# Altium footprint library ICs And Semiconductors SMD_BGA.PcbLib: 118 footprints (part 9 of 17)
Each footprint in its own frame and in the unit in brackets; x right, y up, seen from the top. Pads: shape width x height; smd on the part's side, far side on the other; paste and mask are expansions set on the pad; w line width, h text height; cw(c..) or ccw(c..) is an arc to the next point about the centre after c.
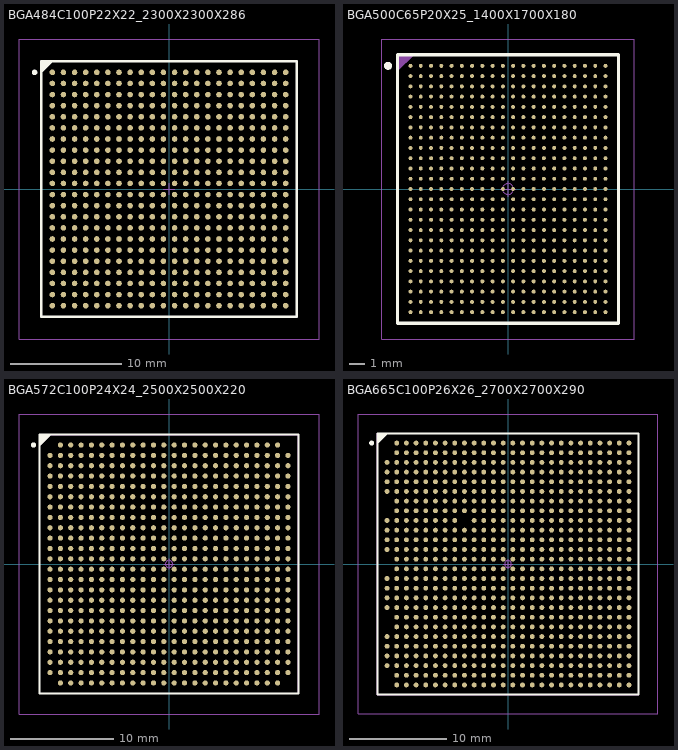
[diagram p8: the footprints below, top view; thin cyan lines are the x and y axes]

## BGA484C100P22X22_2300X2300X286 [mm] "BGA, 1.00mm Pitch, Square; 484 Pin, 22 Columns X 22 Rows, 23.00mm X 23.00mm X 2.86mm H"
height 2.86
pads (484):
  round 0.5 smd: A1(-10.5,10.5) A2(-9.5,10.5) A3(-8.5,10.5) A4(-7.5,10.5) A5(-6.5,10.5) A6(-5.5,10.5) A7(-4.5,10.5) A8(-3.5,10.5) A9(-2.5,10.5) A10(-1.5,10.5) A11(-0.5,10.5) A12(0.5,10.5) A13(1.5,10.5) A14(2.5,10.5) A15(3.5,10.5) A16(4.5,10.5) A17(5.5,10.5) A18(6.5,10.5) A19(7.5,10.5) A20(8.5,10.5) A21(9.5,10.5) A22(10.5,10.5) AA1(-10.5,-9.5) AA2(-9.5,-9.5) AA3(-8.5,-9.5) AA4(-7.5,-9.5) AA5(-6.5,-9.5) AA6(-5.5,-9.5) AA7(-4.5,-9.5) AA8(-3.5,-9.5) AA9(-2.5,-9.5) AA10(-1.5,-9.5) AA11(-0.5,-9.5) AA12(0.5,-9.5) AA13(1.5,-9.5) AA14(2.5,-9.5) AA15(3.5,-9.5) AA16(4.5,-9.5) AA17(5.5,-9.5) AA18(6.5,-9.5) AA19(7.5,-9.5) AA20(8.5,-9.5) AA21(9.5,-9.5) AA22(10.5,-9.5) AB1(-10.5,-10.5) AB2(-9.5,-10.5) AB3(-8.5,-10.5) AB4(-7.5,-10.5) AB5(-6.5,-10.5) AB6(-5.5,-10.5) AB7(-4.5,-10.5) AB8(-3.5,-10.5) AB9(-2.5,-10.5) AB10(-1.5,-10.5) AB11(-0.5,-10.5) AB12(0.5,-10.5) AB13(1.5,-10.5) AB14(2.5,-10.5) AB15(3.5,-10.5) AB16(4.5,-10.5) AB17(5.5,-10.5) AB18(6.5,-10.5) AB19(7.5,-10.5) AB20(8.5,-10.5) AB21(9.5,-10.5) AB22(10.5,-10.5) B1(-10.5,9.5) B2(-9.5,9.5) B3(-8.5,9.5) B4(-7.5,9.5) B5(-6.5,9.5) B6(-5.5,9.5) B7(-4.5,9.5) B8(-3.5,9.5) B9(-2.5,9.5) B10(-1.5,9.5) B11(-0.5,9.5) B12(0.5,9.5) B13(1.5,9.5) B14(2.5,9.5) B15(3.5,9.5) B16(4.5,9.5) B17(5.5,9.5) B18(6.5,9.5) B19(7.5,9.5) B20(8.5,9.5) B21(9.5,9.5) B22(10.5,9.5) C1(-10.5,8.5) C2(-9.5,8.5) C3(-8.5,8.5) C4(-7.5,8.5) C5(-6.5,8.5) C6(-5.5,8.5) C7(-4.5,8.5) C8(-3.5,8.5) C9(-2.5,8.5) C10(-1.5,8.5) C11(-0.5,8.5) C12(0.5,8.5) C13(1.5,8.5) C14(2.5,8.5) C15(3.5,8.5) C16(4.5,8.5) C17(5.5,8.5) C18(6.5,8.5) C19(7.5,8.5) C20(8.5,8.5) C21(9.5,8.5) C22(10.5,8.5) D1(-10.5,7.5) D2(-9.5,7.5) D3(-8.5,7.5) D4(-7.5,7.5) D5(-6.5,7.5) D6(-5.5,7.5) D7(-4.5,7.5) D8(-3.5,7.5) D9(-2.5,7.5) D10(-1.5,7.5) D11(-0.5,7.5) D12(0.5,7.5) D13(1.5,7.5) D14(2.5,7.5) D15(3.5,7.5) D16(4.5,7.5) D17(5.5,7.5) D18(6.5,7.5) D19(7.5,7.5) D20(8.5,7.5) D21(9.5,7.5) D22(10.5,7.5) E1(-10.5,6.5) E2(-9.5,6.5) E3(-8.5,6.5) E4(-7.5,6.5) E5(-6.5,6.5) E6(-5.5,6.5) E7(-4.5,6.5) E8(-3.5,6.5) E9(-2.5,6.5) E10(-1.5,6.5) E11(-0.5,6.5) E12(0.5,6.5) E13(1.5,6.5) E14(2.5,6.5) E15(3.5,6.5) E16(4.5,6.5) E17(5.5,6.5) E18(6.5,6.5) E19(7.5,6.5) E20(8.5,6.5) E21(9.5,6.5) E22(10.5,6.5) F1(-10.5,5.5) F2(-9.5,5.5) F3(-8.5,5.5) F4(-7.5,5.5) F5(-6.5,5.5) F6(-5.5,5.5) F7(-4.5,5.5) F8(-3.5,5.5) F9(-2.5,5.5) F10(-1.5,5.5) F11(-0.5,5.5) F12(0.5,5.5) F13(1.5,5.5) F14(2.5,5.5) F15(3.5,5.5) F16(4.5,5.5) F17(5.5,5.5) F18(6.5,5.5) F19(7.5,5.5) F20(8.5,5.5) F21(9.5,5.5) F22(10.5,5.5) G1(-10.5,4.5) G2(-9.5,4.5) G3(-8.5,4.5) G4(-7.5,4.5) G5(-6.5,4.5) G6(-5.5,4.5) G7(-4.5,4.5) G8(-3.5,4.5) G9(-2.5,4.5) G10(-1.5,4.5) G11(-0.5,4.5) G12(0.5,4.5) G13(1.5,4.5) G14(2.5,4.5) G15(3.5,4.5) G16(4.5,4.5) G17(5.5,4.5) G18(6.5,4.5) G19(7.5,4.5) G20(8.5,4.5) G21(9.5,4.5) G22(10.5,4.5) H1(-10.5,3.5) H2(-9.5,3.5) H3(-8.5,3.5) H4(-7.5,3.5) H5(-6.5,3.5) H6(-5.5,3.5) H7(-4.5,3.5) H8(-3.5,3.5) H9(-2.5,3.5) H10(-1.5,3.5) H11(-0.5,3.5) H12(0.5,3.5) H13(1.5,3.5) H14(2.5,3.5) H15(3.5,3.5) H16(4.5,3.5) H17(5.5,3.5) H18(6.5,3.5) H19(7.5,3.5) H20(8.5,3.5) H21(9.5,3.5) H22(10.5,3.5) J1(-10.5,2.5) J2(-9.5,2.5) J3(-8.5,2.5) J4(-7.5,2.5) J5(-6.5,2.5) J6(-5.5,2.5) J7(-4.5,2.5) J8(-3.5,2.5) J9(-2.5,2.5) J10(-1.5,2.5) J11(-0.5,2.5) J12(0.5,2.5) J13(1.5,2.5) J14(2.5,2.5) J15(3.5,2.5) J16(4.5,2.5) J17(5.5,2.5) J18(6.5,2.5) J19(7.5,2.5) J20(8.5,2.5) J21(9.5,2.5) J22(10.5,2.5) K1(-10.5,1.5) K2(-9.5,1.5) K3(-8.5,1.5) K4(-7.5,1.5) K5(-6.5,1.5) K6(-5.5,1.5) K7(-4.5,1.5) K8(-3.5,1.5) K9(-2.5,1.5) K10(-1.5,1.5) K11(-0.5,1.5) K12(0.5,1.5) K13(1.5,1.5) K14(2.5,1.5) K15(3.5,1.5) K16(4.5,1.5) K17(5.5,1.5) K18(6.5,1.5) K19(7.5,1.5) K20(8.5,1.5) K21(9.5,1.5) K22(10.5,1.5) L1(-10.5,0.5) L2(-9.5,0.5) L3(-8.5,0.5) L4(-7.5,0.5) L5(-6.5,0.5) L6(-5.5,0.5) L7(-4.5,0.5) L8(-3.5,0.5) L9(-2.5,0.5) L10(-1.5,0.5) L11(-0.5,0.5) L12(0.5,0.5) L13(1.5,0.5) L14(2.5,0.5) L15(3.5,0.5) L16(4.5,0.5) L17(5.5,0.5) L18(6.5,0.5) L19(7.5,0.5) L20(8.5,0.5) L21(9.5,0.5) L22(10.5,0.5) M1(-10.5,-0.5) M2(-9.5,-0.5) M3(-8.5,-0.5) M4(-7.5,-0.5) M5(-6.5,-0.5) M6(-5.5,-0.5) M7(-4.5,-0.5) M8(-3.5,-0.5) M9(-2.5,-0.5) M10(-1.5,-0.5) M11(-0.5,-0.5) M12(0.5,-0.5) M13(1.5,-0.5) M14(2.5,-0.5) M15(3.5,-0.5) M16(4.5,-0.5) M17(5.5,-0.5) M18(6.5,-0.5) M19(7.5,-0.5) M20(8.5,-0.5) M21(9.5,-0.5) M22(10.5,-0.5) N1(-10.5,-1.5) N2(-9.5,-1.5) N3(-8.5,-1.5) N4(-7.5,-1.5) N5(-6.5,-1.5) N6(-5.5,-1.5) N7(-4.5,-1.5) N8(-3.5,-1.5) N9(-2.5,-1.5) N10(-1.5,-1.5) N11(-0.5,-1.5) N12(0.5,-1.5) N13(1.5,-1.5) N14(2.5,-1.5) N15(3.5,-1.5) N16(4.5,-1.5) N17(5.5,-1.5) N18(6.5,-1.5) N19(7.5,-1.5) N20(8.5,-1.5) N21(9.5,-1.5) N22(10.5,-1.5) P1(-10.5,-2.5) P2(-9.5,-2.5) P3(-8.5,-2.5) P4(-7.5,-2.5) P5(-6.5,-2.5) P6(-5.5,-2.5) P7(-4.5,-2.5) P8(-3.5,-2.5) P9(-2.5,-2.5) P10(-1.5,-2.5) P11(-0.5,-2.5) P12(0.5,-2.5) P13(1.5,-2.5) P14(2.5,-2.5) P15(3.5,-2.5) P16(4.5,-2.5) P17(5.5,-2.5) P18(6.5,-2.5) P19(7.5,-2.5) P20(8.5,-2.5) P21(9.5,-2.5) P22(10.5,-2.5) R1(-10.5,-3.5) R2(-9.5,-3.5) R3(-8.5,-3.5) R4(-7.5,-3.5) R5(-6.5,-3.5) R6(-5.5,-3.5) R7(-4.5,-3.5) R8(-3.5,-3.5) R9(-2.5,-3.5) R10(-1.5,-3.5) R11(-0.5,-3.5) R12(0.5,-3.5) R13(1.5,-3.5) R14(2.5,-3.5) R15(3.5,-3.5) R16(4.5,-3.5) R17(5.5,-3.5) R18(6.5,-3.5) R19(7.5,-3.5) R20(8.5,-3.5) R21(9.5,-3.5) R22(10.5,-3.5) T1(-10.5,-4.5) T2(-9.5,-4.5) T3(-8.5,-4.5) T4(-7.5,-4.5) T5(-6.5,-4.5) T6(-5.5,-4.5) T7(-4.5,-4.5) T8(-3.5,-4.5) T9(-2.5,-4.5) T10(-1.5,-4.5) T11(-0.5,-4.5) T12(0.5,-4.5) T13(1.5,-4.5) T14(2.5,-4.5) T15(3.5,-4.5) T16(4.5,-4.5) T17(5.5,-4.5) T18(6.5,-4.5) T19(7.5,-4.5) T20(8.5,-4.5) T21(9.5,-4.5) T22(10.5,-4.5) U1(-10.5,-5.5) U2(-9.5,-5.5) U3(-8.5,-5.5) U4(-7.5,-5.5) U5(-6.5,-5.5) U6(-5.5,-5.5) U7(-4.5,-5.5) U8(-3.5,-5.5) U9(-2.5,-5.5) U10(-1.5,-5.5) U11(-0.5,-5.5) U12(0.5,-5.5) U13(1.5,-5.5) U14(2.5,-5.5) U15(3.5,-5.5) U16(4.5,-5.5) U17(5.5,-5.5) U18(6.5,-5.5) U19(7.5,-5.5) U20(8.5,-5.5) U21(9.5,-5.5) U22(10.5,-5.5) V1(-10.5,-6.5) V2(-9.5,-6.5) V3(-8.5,-6.5) V4(-7.5,-6.5) V5(-6.5,-6.5) V6(-5.5,-6.5) V7(-4.5,-6.5) V8(-3.5,-6.5) V9(-2.5,-6.5) V10(-1.5,-6.5) V11(-0.5,-6.5) V12(0.5,-6.5) V13(1.5,-6.5) V14(2.5,-6.5) V15(3.5,-6.5) V16(4.5,-6.5) V17(5.5,-6.5) V18(6.5,-6.5) V19(7.5,-6.5) V20(8.5,-6.5) V21(9.5,-6.5) V22(10.5,-6.5) W1(-10.5,-7.5) W2(-9.5,-7.5) W3(-8.5,-7.5) W4(-7.5,-7.5) W5(-6.5,-7.5) W6(-5.5,-7.5) W7(-4.5,-7.5) W8(-3.5,-7.5) W9(-2.5,-7.5) W10(-1.5,-7.5) W11(-0.5,-7.5) W12(0.5,-7.5) W13(1.5,-7.5) W14(2.5,-7.5) W15(3.5,-7.5) W16(4.5,-7.5) W17(5.5,-7.5) W18(6.5,-7.5) W19(7.5,-7.5) W20(8.5,-7.5) W21(9.5,-7.5) W22(10.5,-7.5) Y1(-10.5,-8.5) Y2(-9.5,-8.5) Y3(-8.5,-8.5) Y4(-7.5,-8.5) Y5(-6.5,-8.5) Y6(-5.5,-8.5) Y7(-4.5,-8.5) Y8(-3.5,-8.5) Y9(-2.5,-8.5) Y10(-1.5,-8.5) Y11(-0.5,-8.5) Y12(0.5,-8.5) Y13(1.5,-8.5) Y14(2.5,-8.5) Y15(3.5,-8.5) Y16(4.5,-8.5) Y17(5.5,-8.5) Y18(6.5,-8.5) Y19(7.5,-8.5) Y20(8.5,-8.5) Y21(9.5,-8.5) Y22(10.5,-8.5)
Top Overlay:
  circle w0.25: c-12.1,10.5 r0.125
  lines w0.2: -11.5,10.5 -10.5,11.5 ; -11.5,10.7 -10.7,11.5 ; -11.5,10.9 -10.9,11.5 ; -11.5,11.1 -11.1,11.5 ; -11.5,11.3 -11.3,11.5 ; -11.5,-11.5 0,-11.5 11.5,-11.5 11.5,11.5 -11.5,11.5 -11.5,-11.5
Mechanical 14:
  lines w0.1: -11.5,10.5 -10.5,11.5 ; -11.5,10.6 -10.6,11.5 ; -11.5,10.7 -10.7,11.5 ; -11.5,10.8 -10.8,11.5 ; -11.5,10.9 -10.9,11.5 ; -11.5,11 -11,11.5 ; -11.5,11.1 -11.1,11.5 ; -11.5,11.2 -11.2,11.5 ; -11.5,11.3 -11.3,11.5 ; -11.5,11.4 -11.4,11.5 ; -11.5,-11.5 -11.5,11.5 11.5,11.5 11.5,-11.5 0,-11.5 -11.5,-11.5
  text "AB" at -12.9,-10.8 h0.6
  text "AA" at -12.9,-9.8 h0.6
  text "Y" at -12.4,-8.8 h0.6
  text "W" at -12.4,-7.8 h0.6
  text "V" at -12.4,-6.8 h0.6
  text "U" at -12.4,-5.8 h0.6
  text "T" at -12.4,-4.8 h0.6
  text "R" at -12.4,-3.8 h0.6
  text "P" at -12.4,-2.8 h0.6
  text "N" at -12.4,-1.8 h0.6
  text "M" at -12.4,-0.8 h0.6
  text "L" at -12.4,0.2 h0.6
  text "K" at -12.4,1.2 h0.6
  text "J" at -12.4,2.2 h0.6
  text "H" at -12.4,3.2 h0.6
  text "G" at -12.4,4.2 h0.6
  text "F" at -12.4,5.2 h0.6
  text "E" at -12.4,6.2 h0.6
  text "D" at -12.4,7.2 h0.6
  text "C" at -12.4,8.2 h0.6
  text "B" at -12.4,9.2 h0.6
  text "A" at -12.4,10.2 h0.6
  text "2" at -9.25,12 h0.6
  text "3" at -8.25,12 h0.6
  text "4" at -7.25,12 h0.6
  text "5" at -6.25,12 h0.6
  text "16" at 4.75,12 h0.6
  text "15" at 3.75,12 h0.6
  text "14" at 2.75,12 h0.6
  text "13" at 1.75,12 h0.6
  text "12" at 0.75,12 h0.6
  text "11" at -0.25,12 h0.6
  text "10" at -1.25,12 h0.6
  text "9" at -2.25,12 h0.6
  text "8" at -3.25,12 h0.6
  text "7" at -4.25,12 h0.6
  text "6" at -5.25,12 h0.6
  text "1" at -10.25,12 h0.6
  text "18" at 6.75,12 h0.6
  text "19" at 7.75,12 h0.6
  text "20" at 8.75,12 h0.6
  text "21" at 9.75,12 h0.6
  text "22" at 10.7,12 h0.6
  text "17" at 5.75,12 h0.6
Mechanical 15:
  lines w0.05: -0.5,0 0.5,0 ; 0,-0.5 0,0.5 ; -13.5,-13.5 -13.5,13.5 13.5,13.5 13.5,-13.5 -13.5,-13.5
3D body "BGA484C100P22X22_2300X2300X286.stp": height 2.86, standoff 0, extent -11.5,-11.5 11.5,11.5

## BGA500C65P20X25_1400X1700X180 [mm] "BGA,0.65mm Pitch, Rect. ;500 Pin, 20 Columns X 25 Rows, 14.00mm X 17.00mm X 1.80mm H"
height 1.8
pads (500):
  round 0.25 smd: A1(-6.175,7.8) A2(-5.525,7.8) A3(-4.875,7.8) A4(-4.225,7.8) A5(-3.575,7.8) A6(-2.925,7.8) A7(-2.275,7.8) A8(-1.625,7.8) A9(-0.975,7.8) A10(-0.325,7.8) A11(0.325,7.8) A12(0.975,7.8) A13(1.625,7.8) A14(2.275,7.8) A15(2.925,7.8) A16(3.575,7.8) A17(4.225,7.8) A18(4.875,7.8) A19(5.525,7.8) A20(6.175,7.8) AA1(-6.175,-5.2) AA2(-5.525,-5.2) AA3(-4.875,-5.2) AA4(-4.225,-5.2) AA5(-3.575,-5.2) AA6(-2.925,-5.2) AA7(-2.275,-5.2) AA8(-1.625,-5.2) AA9(-0.975,-5.2) AA10(-0.325,-5.2) AA11(0.325,-5.2) AA12(0.975,-5.2) AA13(1.625,-5.2) AA14(2.275,-5.2) AA15(2.925,-5.2) AA16(3.575,-5.2) AA17(4.225,-5.2) AA18(4.875,-5.2) AA19(5.525,-5.2) AA20(6.175,-5.2) AB1(-6.175,-5.85) AB2(-5.525,-5.85) AB3(-4.875,-5.85) AB4(-4.225,-5.85) AB5(-3.575,-5.85) AB6(-2.925,-5.85) AB7(-2.275,-5.85) AB8(-1.625,-5.85) AB9(-0.975,-5.85) AB10(-0.325,-5.85) AB11(0.325,-5.85) AB12(0.975,-5.85) AB13(1.625,-5.85) AB14(2.275,-5.85) AB15(2.925,-5.85) AB16(3.575,-5.85) AB17(4.225,-5.85) AB18(4.875,-5.85) AB19(5.525,-5.85) AB20(6.175,-5.85) AC1(-6.175,-6.5) AC2(-5.525,-6.5) AC3(-4.875,-6.5) AC4(-4.225,-6.5) AC5(-3.575,-6.5) AC6(-2.925,-6.5) AC7(-2.275,-6.5) AC8(-1.625,-6.5) AC9(-0.975,-6.5) AC10(-0.325,-6.5) AC11(0.325,-6.5) AC12(0.975,-6.5) AC13(1.625,-6.5) AC14(2.275,-6.5) AC15(2.925,-6.5) AC16(3.575,-6.5) AC17(4.225,-6.5) AC18(4.875,-6.5) AC19(5.525,-6.5) AC20(6.175,-6.5) AD1(-6.175,-7.15) AD2(-5.525,-7.15) AD3(-4.875,-7.15) AD4(-4.225,-7.15) AD5(-3.575,-7.15) AD6(-2.925,-7.15) AD7(-2.275,-7.15) AD8(-1.625,-7.15) AD9(-0.975,-7.15) AD10(-0.325,-7.15) AD11(0.325,-7.15) AD12(0.975,-7.15) AD13(1.625,-7.15) AD14(2.275,-7.15) AD15(2.925,-7.15) AD16(3.575,-7.15) AD17(4.225,-7.15) AD18(4.875,-7.15) AD19(5.525,-7.15) AD20(6.175,-7.15) AE1(-6.175,-7.8) AE2(-5.525,-7.8) AE3(-4.875,-7.8) AE4(-4.225,-7.8) AE5(-3.575,-7.8) AE6(-2.925,-7.8) AE7(-2.275,-7.8) AE8(-1.625,-7.8) AE9(-0.975,-7.8) AE10(-0.325,-7.8) AE11(0.325,-7.8) AE12(0.975,-7.8) AE13(1.625,-7.8) AE14(2.275,-7.8) AE15(2.925,-7.8) AE16(3.575,-7.8) AE17(4.225,-7.8) AE18(4.875,-7.8) AE19(5.525,-7.8) AE20(6.175,-7.8) B1(-6.175,7.15) B2(-5.525,7.15) B3(-4.875,7.15) B4(-4.225,7.15) B5(-3.575,7.15) B6(-2.925,7.15) B7(-2.275,7.15) B8(-1.625,7.15) B9(-0.975,7.15) B10(-0.325,7.15) B11(0.325,7.15) B12(0.975,7.15) B13(1.625,7.15) B14(2.275,7.15) B15(2.925,7.15) B16(3.575,7.15) B17(4.225,7.15) B18(4.875,7.15) B19(5.525,7.15) B20(6.175,7.15) C1(-6.175,6.5) C2(-5.525,6.5) C3(-4.875,6.5) C4(-4.225,6.5) C5(-3.575,6.5) C6(-2.925,6.5) C7(-2.275,6.5) C8(-1.625,6.5) C9(-0.975,6.5) C10(-0.325,6.5) C11(0.325,6.5) C12(0.975,6.5) C13(1.625,6.5) C14(2.275,6.5) C15(2.925,6.5) C16(3.575,6.5) C17(4.225,6.5) C18(4.875,6.5) C19(5.525,6.5) C20(6.175,6.5) D1(-6.175,5.85) D2(-5.525,5.85) D3(-4.875,5.85) D4(-4.225,5.85) D5(-3.575,5.85) D6(-2.925,5.85) D7(-2.275,5.85) D8(-1.625,5.85) D9(-0.975,5.85) D10(-0.325,5.85) D11(0.325,5.85) D12(0.975,5.85) D13(1.625,5.85) D14(2.275,5.85) D15(2.925,5.85) D16(3.575,5.85) D17(4.225,5.85) D18(4.875,5.85) D19(5.525,5.85) D20(6.175,5.85) E1(-6.175,5.2) E2(-5.525,5.2) E3(-4.875,5.2) E4(-4.225,5.2) E5(-3.575,5.2) E6(-2.925,5.2) E7(-2.275,5.2) E8(-1.625,5.2) E9(-0.975,5.2) E10(-0.325,5.2) E11(0.325,5.2) E12(0.975,5.2) E13(1.625,5.2) E14(2.275,5.2) E15(2.925,5.2) E16(3.575,5.2) E17(4.225,5.2) E18(4.875,5.2) E19(5.525,5.2) E20(6.175,5.2) F1(-6.175,4.55) F2(-5.525,4.55) F3(-4.875,4.55) F4(-4.225,4.55) F5(-3.575,4.55) F6(-2.925,4.55) F7(-2.275,4.55) F8(-1.625,4.55) F9(-0.975,4.55) F10(-0.325,4.55) F11(0.325,4.55) F12(0.975,4.55) F13(1.625,4.55) F14(2.275,4.55) F15(2.925,4.55) F16(3.575,4.55) F17(4.225,4.55) F18(4.875,4.55) F19(5.525,4.55) F20(6.175,4.55) G1(-6.175,3.9) G2(-5.525,3.9) G3(-4.875,3.9) G4(-4.225,3.9) G5(-3.575,3.9) G6(-2.925,3.9) G7(-2.275,3.9) G8(-1.625,3.9) G9(-0.975,3.9) G10(-0.325,3.9) G11(0.325,3.9) G12(0.975,3.9) G13(1.625,3.9) G14(2.275,3.9) G15(2.925,3.9) G16(3.575,3.9) G17(4.225,3.9) G18(4.875,3.9) G19(5.525,3.9) G20(6.175,3.9) H1(-6.175,3.25) H2(-5.525,3.25) H3(-4.875,3.25) H4(-4.225,3.25) H5(-3.575,3.25) H6(-2.925,3.25) H7(-2.275,3.25) H8(-1.625,3.25) H9(-0.975,3.25) H10(-0.325,3.25) H11(0.325,3.25) H12(0.975,3.25) H13(1.625,3.25) H14(2.275,3.25) H15(2.925,3.25) H16(3.575,3.25) H17(4.225,3.25) H18(4.875,3.25) H19(5.525,3.25) H20(6.175,3.25) J1(-6.175,2.6) J2(-5.525,2.6) J3(-4.875,2.6) J4(-4.225,2.6) J5(-3.575,2.6) J6(-2.925,2.6) J7(-2.275,2.6) J8(-1.625,2.6) J9(-0.975,2.6) J10(-0.325,2.6) J11(0.325,2.6) J12(0.975,2.6) J13(1.625,2.6) J14(2.275,2.6) J15(2.925,2.6) J16(3.575,2.6) J17(4.225,2.6) J18(4.875,2.6) J19(5.525,2.6) J20(6.175,2.6) K1(-6.175,1.95) K2(-5.525,1.95) K3(-4.875,1.95) K4(-4.225,1.95) K5(-3.575,1.95) K6(-2.925,1.95) K7(-2.275,1.95) K8(-1.625,1.95) K9(-0.975,1.95) K10(-0.325,1.95) K11(0.325,1.95) K12(0.975,1.95) K13(1.625,1.95) K14(2.275,1.95) K15(2.925,1.95) K16(3.575,1.95) K17(4.225,1.95) K18(4.875,1.95) K19(5.525,1.95) K20(6.175,1.95) L1(-6.175,1.3) L2(-5.525,1.3) L3(-4.875,1.3) L4(-4.225,1.3) L5(-3.575,1.3) L6(-2.925,1.3) L7(-2.275,1.3) L8(-1.625,1.3) L9(-0.975,1.3) L10(-0.325,1.3) L11(0.325,1.3) L12(0.975,1.3) L13(1.625,1.3) L14(2.275,1.3) L15(2.925,1.3) L16(3.575,1.3) L17(4.225,1.3) L18(4.875,1.3) L19(5.525,1.3) L20(6.175,1.3) M1(-6.175,0.65) M2(-5.525,0.65) M3(-4.875,0.65) M4(-4.225,0.65) M5(-3.575,0.65) M6(-2.925,0.65) M7(-2.275,0.65) M8(-1.625,0.65) M9(-0.975,0.65) M10(-0.325,0.65) M11(0.325,0.65) M12(0.975,0.65) M13(1.625,0.65) M14(2.275,0.65) M15(2.925,0.65) M16(3.575,0.65) M17(4.225,0.65) M18(4.875,0.65) M19(5.525,0.65) M20(6.175,0.65) N1(-6.175,0) N2(-5.525,0) N3(-4.875,0) N4(-4.225,0) N5(-3.575,0) N6(-2.925,0) N7(-2.275,0) N8(-1.625,0) N9(-0.975,0) N10(-0.325,0) N11(0.325,0) N12(0.975,0) N13(1.625,0) N14(2.275,0) N15(2.925,0) N16(3.575,0) N17(4.225,0) N18(4.875,0) N19(5.525,0) N20(6.175,0) P1(-6.175,-0.65) P2(-5.525,-0.65) P3(-4.875,-0.65) P4(-4.225,-0.65) P5(-3.575,-0.65) P6(-2.925,-0.65) P7(-2.275,-0.65) P8(-1.625,-0.65) P9(-0.975,-0.65) P10(-0.325,-0.65) P11(0.325,-0.65) P12(0.975,-0.65) P13(1.625,-0.65) P14(2.275,-0.65) P15(2.925,-0.65) P16(3.575,-0.65) P17(4.225,-0.65) P18(4.875,-0.65) P19(5.525,-0.65) P20(6.175,-0.65) R1(-6.175,-1.3) R2(-5.525,-1.3) R3(-4.875,-1.3) R4(-4.225,-1.3) R5(-3.575,-1.3) R6(-2.925,-1.3) R7(-2.275,-1.3) R8(-1.625,-1.3) R9(-0.975,-1.3) R10(-0.325,-1.3) R11(0.325,-1.3) R12(0.975,-1.3) R13(1.625,-1.3) R14(2.275,-1.3) R15(2.925,-1.3) R16(3.575,-1.3) R17(4.225,-1.3) R18(4.875,-1.3) R19(5.525,-1.3) R20(6.175,-1.3) T1(-6.175,-1.95) T2(-5.525,-1.95) T3(-4.875,-1.95) T4(-4.225,-1.95) T5(-3.575,-1.95) T6(-2.925,-1.95) T7(-2.275,-1.95) T8(-1.625,-1.95) T9(-0.975,-1.95) T10(-0.325,-1.95) T11(0.325,-1.95) T12(0.975,-1.95) T13(1.625,-1.95) T14(2.275,-1.95) T15(2.925,-1.95) T16(3.575,-1.95) T17(4.225,-1.95) T18(4.875,-1.95) T19(5.525,-1.95) T20(6.175,-1.95) U1(-6.175,-2.6) U2(-5.525,-2.6) U3(-4.875,-2.6) U4(-4.225,-2.6) U5(-3.575,-2.6) U6(-2.925,-2.6) U7(-2.275,-2.6) U8(-1.625,-2.6) U9(-0.975,-2.6) U10(-0.325,-2.6) U11(0.325,-2.6) U12(0.975,-2.6) U13(1.625,-2.6) U14(2.275,-2.6) U15(2.925,-2.6) U16(3.575,-2.6) U17(4.225,-2.6) U18(4.875,-2.6) U19(5.525,-2.6) U20(6.175,-2.6) V1(-6.175,-3.25) V2(-5.525,-3.25) V3(-4.875,-3.25) V4(-4.225,-3.25) V5(-3.575,-3.25) V6(-2.925,-3.25) V7(-2.275,-3.25) V8(-1.625,-3.25) V9(-0.975,-3.25) V10(-0.325,-3.25) V11(0.325,-3.25) V12(0.975,-3.25) V13(1.625,-3.25) V14(2.275,-3.25) V15(2.925,-3.25) V16(3.575,-3.25) V17(4.225,-3.25) V18(4.875,-3.25) V19(5.525,-3.25) V20(6.175,-3.25) W1(-6.175,-3.9) W2(-5.525,-3.9) W3(-4.875,-3.9) W4(-4.225,-3.9) W5(-3.575,-3.9) W6(-2.925,-3.9) W7(-2.275,-3.9) W8(-1.625,-3.9) W9(-0.975,-3.9) W10(-0.325,-3.9) W11(0.325,-3.9) W12(0.975,-3.9) W13(1.625,-3.9) W14(2.275,-3.9) W15(2.925,-3.9) W16(3.575,-3.9) W17(4.225,-3.9) W18(4.875,-3.9) W19(5.525,-3.9) W20(6.175,-3.9) Y1(-6.175,-4.55) Y2(-5.525,-4.55) Y3(-4.875,-4.55) Y4(-4.225,-4.55) Y5(-3.575,-4.55) Y6(-2.925,-4.55) Y7(-2.275,-4.55) Y8(-1.625,-4.55) Y9(-0.975,-4.55) Y10(-0.325,-4.55) Y11(0.325,-4.55) Y12(0.975,-4.55) Y13(1.625,-4.55) Y14(2.275,-4.55) Y15(2.925,-4.55) Y16(3.575,-4.55) Y17(4.225,-4.55) Y18(4.875,-4.55) Y19(5.525,-4.55) Y20(6.175,-4.55)
Top Overlay:
  circle w0.25: c-7.6,7.8 r0.125
  lines w0.2: -7,-8.5 -7,8.5 7,8.5 7,-8.5 -7,-8.5
Mechanical 14:
  lines w0.1: -7,7.5 -6,8.5 ; -7,7.6 -6.1,8.5 ; -7,7.7 -6.2,8.5 ; -7,7.8 -6.3,8.5 ; -7,7.9 -6.4,8.5 ; -7,8 -6.5,8.5 ; -7,8.1 -6.6,8.5 ; -7,8.2 -6.7,8.5 ; -7,8.3 -6.8,8.5 ; -7,8.4 -6.9,8.5 ; -7,-8.5 -7,8.5 7,8.5 7,-8.5 -7,-8.5
  text "AE" at -8.25,-8 h0.5
  text "20" at 6.5,9 h0.5
  text "A" at -7.7,7.7 h0.5
  text "1" at -6.25,8.9 h0.5
Mechanical 15:
  circle w0.05: c0,0 r0.35
  lines w0.05: -0.5,0 0.5,0 ; 0,-0.5 0,0.5 ; -8,-9.5 -8,9.5 8,9.5 8,-9.5 -8,-9.5
3D body "BGA500C65P20X25_1400X1700X180.stp": height 1.8, standoff 0, extent -7,-8.5 7,8.5

## BGA572C100P24X24_2500X2500X220 [mm] "BGA, 1.00mm Pitch, Square; 572 Pin,24 Columns X 24 Rows,25.00mm X 25.00mm X 2.20mm H"
height 2.2
pads (572):
  round 0.5 smd: A2(-10.5,11.5) A3(-9.5,11.5) A4(-8.5,11.5) A5(-7.5,11.5) A6(-6.5,11.5) A7(-5.5,11.5) A8(-4.5,11.5) A9(-3.5,11.5) A10(-2.5,11.5) A11(-1.5,11.5) A12(-0.5,11.5) A13(0.5,11.5) A14(1.5,11.5) A15(2.5,11.5) A16(3.5,11.5) A17(4.5,11.5) A18(5.5,11.5) A19(6.5,11.5) A20(7.5,11.5) A21(8.5,11.5) A22(9.5,11.5) A23(10.5,11.5) AA1(-11.5,-8.5) AA2(-10.5,-8.5) AA3(-9.5,-8.5) AA4(-8.5,-8.5) AA5(-7.5,-8.5) AA6(-6.5,-8.5) AA7(-5.5,-8.5) AA8(-4.5,-8.5) AA9(-3.5,-8.5) AA10(-2.5,-8.5) AA11(-1.5,-8.5) AA12(-0.5,-8.5) AA13(0.5,-8.5) AA14(1.5,-8.5) AA15(2.5,-8.5) AA16(3.5,-8.5) AA17(4.5,-8.5) AA18(5.5,-8.5) AA19(6.5,-8.5) AA20(7.5,-8.5) AA21(8.5,-8.5) AA22(9.5,-8.5) AA23(10.5,-8.5) AA24(11.5,-8.5) AB1(-11.5,-9.5) AB2(-10.5,-9.5) AB3(-9.5,-9.5) AB4(-8.5,-9.5) AB5(-7.5,-9.5) AB6(-6.5,-9.5) AB7(-5.5,-9.5) AB8(-4.5,-9.5) AB9(-3.5,-9.5) AB10(-2.5,-9.5) AB11(-1.5,-9.5) AB12(-0.5,-9.5) AB13(0.5,-9.5) AB14(1.5,-9.5) AB15(2.5,-9.5) AB16(3.5,-9.5) AB17(4.5,-9.5) AB18(5.5,-9.5) AB19(6.5,-9.5) AB20(7.5,-9.5) AB21(8.5,-9.5) AB22(9.5,-9.5) AB23(10.5,-9.5) AB24(11.5,-9.5) AC1(-11.5,-10.5) AC2(-10.5,-10.5) AC3(-9.5,-10.5) AC4(-8.5,-10.5) AC5(-7.5,-10.5) AC6(-6.5,-10.5) AC7(-5.5,-10.5) AC8(-4.5,-10.5) AC9(-3.5,-10.5) AC10(-2.5,-10.5) AC11(-1.5,-10.5) AC12(-0.5,-10.5) AC13(0.5,-10.5) AC14(1.5,-10.5) AC15(2.5,-10.5) AC16(3.5,-10.5) AC17(4.5,-10.5) AC18(5.5,-10.5) AC19(6.5,-10.5) AC20(7.5,-10.5) AC21(8.5,-10.5) AC22(9.5,-10.5) AC23(10.5,-10.5) AC24(11.5,-10.5) AD2(-10.5,-11.5) AD3(-9.5,-11.5) AD4(-8.5,-11.5) AD5(-7.5,-11.5) AD6(-6.5,-11.5) AD7(-5.5,-11.5) AD8(-4.5,-11.5) AD9(-3.5,-11.5) AD10(-2.5,-11.5) AD11(-1.5,-11.5) AD12(-0.5,-11.5) AD13(0.5,-11.5) AD14(1.5,-11.5) AD15(2.5,-11.5) AD16(3.5,-11.5) AD17(4.5,-11.5) AD18(5.5,-11.5) AD19(6.5,-11.5) AD20(7.5,-11.5) AD21(8.5,-11.5) AD22(9.5,-11.5) AD23(10.5,-11.5) B1(-11.5,10.5) B2(-10.5,10.5) B3(-9.5,10.5) B4(-8.5,10.5) B5(-7.5,10.5) B6(-6.5,10.5) B7(-5.5,10.5) B8(-4.5,10.5) B9(-3.5,10.5) B10(-2.5,10.5) B11(-1.5,10.5) B12(-0.5,10.5) B13(0.5,10.5) B14(1.5,10.5) B15(2.5,10.5) B16(3.5,10.5) B17(4.5,10.5) B18(5.5,10.5) B19(6.5,10.5) B20(7.5,10.5) B21(8.5,10.5) B22(9.5,10.5) B23(10.5,10.5) B24(11.5,10.5) C1(-11.5,9.5) C2(-10.5,9.5) C3(-9.5,9.5) C4(-8.5,9.5) C5(-7.5,9.5) C6(-6.5,9.5) C7(-5.5,9.5) C8(-4.5,9.5) C9(-3.5,9.5) C10(-2.5,9.5) C11(-1.5,9.5) C12(-0.5,9.5) C13(0.5,9.5) C14(1.5,9.5) C15(2.5,9.5) C16(3.5,9.5) C17(4.5,9.5) C18(5.5,9.5) C19(6.5,9.5) C20(7.5,9.5) C21(8.5,9.5) C22(9.5,9.5) C23(10.5,9.5) C24(11.5,9.5) D1(-11.5,8.5) D2(-10.5,8.5) D3(-9.5,8.5) D4(-8.5,8.5) D5(-7.5,8.5) D6(-6.5,8.5) D7(-5.5,8.5) D8(-4.5,8.5) D9(-3.5,8.5) D10(-2.5,8.5) D11(-1.5,8.5) D12(-0.5,8.5) D13(0.5,8.5) D14(1.5,8.5) D15(2.5,8.5) D16(3.5,8.5) D17(4.5,8.5) D18(5.5,8.5) D19(6.5,8.5) D20(7.5,8.5) D21(8.5,8.5) D22(9.5,8.5) D23(10.5,8.5) D24(11.5,8.5) E1(-11.5,7.5) E2(-10.5,7.5) E3(-9.5,7.5) E4(-8.5,7.5) E5(-7.5,7.5) E6(-6.5,7.5) E7(-5.5,7.5) E8(-4.5,7.5) E9(-3.5,7.5) E10(-2.5,7.5) E11(-1.5,7.5) E12(-0.5,7.5) E13(0.5,7.5) E14(1.5,7.5) E15(2.5,7.5) E16(3.5,7.5) E17(4.5,7.5) E18(5.5,7.5) E19(6.5,7.5) E20(7.5,7.5) E21(8.5,7.5) E22(9.5,7.5) E23(10.5,7.5) E24(11.5,7.5) F1(-11.5,6.5) F2(-10.5,6.5) F3(-9.5,6.5) F4(-8.5,6.5) F5(-7.5,6.5) F6(-6.5,6.5) F7(-5.5,6.5) F8(-4.5,6.5) F9(-3.5,6.5) F10(-2.5,6.5) F11(-1.5,6.5) F12(-0.5,6.5) F13(0.5,6.5) F14(1.5,6.5) F15(2.5,6.5) F16(3.5,6.5) F17(4.5,6.5) F18(5.5,6.5) F19(6.5,6.5) F20(7.5,6.5) F21(8.5,6.5) F22(9.5,6.5) F23(10.5,6.5) F24(11.5,6.5) G1(-11.5,5.5) G2(-10.5,5.5) G3(-9.5,5.5) G4(-8.5,5.5) G5(-7.5,5.5) G6(-6.5,5.5) G7(-5.5,5.5) G8(-4.5,5.5) G9(-3.5,5.5) G10(-2.5,5.5) G11(-1.5,5.5) G12(-0.5,5.5) G13(0.5,5.5) G14(1.5,5.5) G15(2.5,5.5) G16(3.5,5.5) G17(4.5,5.5) G18(5.5,5.5) G19(6.5,5.5) G20(7.5,5.5) G21(8.5,5.5) G22(9.5,5.5) G23(10.5,5.5) G24(11.5,5.5) H1(-11.5,4.5) H2(-10.5,4.5) H3(-9.5,4.5) H4(-8.5,4.5) H5(-7.5,4.5) H6(-6.5,4.5) H7(-5.5,4.5) H8(-4.5,4.5) H9(-3.5,4.5) H10(-2.5,4.5) H11(-1.5,4.5) H12(-0.5,4.5) H13(0.5,4.5) H14(1.5,4.5) H15(2.5,4.5) H16(3.5,4.5) H17(4.5,4.5) H18(5.5,4.5) H19(6.5,4.5) H20(7.5,4.5) H21(8.5,4.5) H22(9.5,4.5) H23(10.5,4.5) H24(11.5,4.5) J1(-11.5,3.5) J2(-10.5,3.5) J3(-9.5,3.5) J4(-8.5,3.5) J5(-7.5,3.5) J6(-6.5,3.5) J7(-5.5,3.5) J8(-4.5,3.5) J9(-3.5,3.5) J10(-2.5,3.5) J11(-1.5,3.5) J12(-0.5,3.5) J13(0.5,3.5) J14(1.5,3.5) J15(2.5,3.5) J16(3.5,3.5) J17(4.5,3.5) J18(5.5,3.5) J19(6.5,3.5) J20(7.5,3.5) J21(8.5,3.5) J22(9.5,3.5) J23(10.5,3.5) J24(11.5,3.5) K1(-11.5,2.5) K2(-10.5,2.5) K3(-9.5,2.5) K4(-8.5,2.5) K5(-7.5,2.5) K6(-6.5,2.5) K7(-5.5,2.5) K8(-4.5,2.5) K9(-3.5,2.5) K10(-2.5,2.5) K11(-1.5,2.5) K12(-0.5,2.5) K13(0.5,2.5) K14(1.5,2.5) K15(2.5,2.5) K16(3.5,2.5) K17(4.5,2.5) K18(5.5,2.5) K19(6.5,2.5) K20(7.5,2.5) K21(8.5,2.5) K22(9.5,2.5) K23(10.5,2.5) K24(11.5,2.5) L1(-11.5,1.5) L2(-10.5,1.5) L3(-9.5,1.5) L4(-8.5,1.5) L5(-7.5,1.5) L6(-6.5,1.5) L7(-5.5,1.5) L8(-4.5,1.5) L9(-3.5,1.5) L10(-2.5,1.5) L11(-1.5,1.5) L12(-0.5,1.5) L13(0.5,1.5) L14(1.5,1.5) L15(2.5,1.5) L16(3.5,1.5) L17(4.5,1.5) L18(5.5,1.5) L19(6.5,1.5) L20(7.5,1.5) L21(8.5,1.5) L22(9.5,1.5) L23(10.5,1.5) L24(11.5,1.5) M1(-11.5,0.5) M2(-10.5,0.5) M3(-9.5,0.5) M4(-8.5,0.5) M5(-7.5,0.5) M6(-6.5,0.5) M7(-5.5,0.5) M8(-4.5,0.5) M9(-3.5,0.5) M10(-2.5,0.5) M11(-1.5,0.5) M12(-0.5,0.5) M13(0.5,0.5) M14(1.5,0.5) M15(2.5,0.5) M16(3.5,0.5) M17(4.5,0.5) M18(5.5,0.5) M19(6.5,0.5) M20(7.5,0.5) M21(8.5,0.5) M22(9.5,0.5) M23(10.5,0.5) M24(11.5,0.5) N1(-11.5,-0.5) N2(-10.5,-0.5) N3(-9.5,-0.5) N4(-8.5,-0.5) N5(-7.5,-0.5) N6(-6.5,-0.5) N7(-5.5,-0.5) N8(-4.5,-0.5) N9(-3.5,-0.5) N10(-2.5,-0.5) N11(-1.5,-0.5) N12(-0.5,-0.5) N13(0.5,-0.5) N14(1.5,-0.5) N15(2.5,-0.5) N16(3.5,-0.5) N17(4.5,-0.5) N18(5.5,-0.5) N19(6.5,-0.5) N20(7.5,-0.5) N21(8.5,-0.5) N22(9.5,-0.5) N23(10.5,-0.5) N24(11.5,-0.5) P1(-11.5,-1.5) P2(-10.5,-1.5) P3(-9.5,-1.5) P4(-8.5,-1.5) P5(-7.5,-1.5) P6(-6.5,-1.5) P7(-5.5,-1.5) P8(-4.5,-1.5) P9(-3.5,-1.5) P10(-2.5,-1.5) P11(-1.5,-1.5) P12(-0.5,-1.5) P13(0.5,-1.5) P14(1.5,-1.5) P15(2.5,-1.5) P16(3.5,-1.5) P17(4.5,-1.5) P18(5.5,-1.5) P19(6.5,-1.5) P20(7.5,-1.5) P21(8.5,-1.5) P22(9.5,-1.5) P23(10.5,-1.5) P24(11.5,-1.5) R1(-11.5,-2.5) R2(-10.5,-2.5) R3(-9.5,-2.5) R4(-8.5,-2.5) R5(-7.5,-2.5) R6(-6.5,-2.5) R7(-5.5,-2.5) R8(-4.5,-2.5) R9(-3.5,-2.5) R10(-2.5,-2.5) R11(-1.5,-2.5) R12(-0.5,-2.5) R13(0.5,-2.5) R14(1.5,-2.5) R15(2.5,-2.5) R16(3.5,-2.5) R17(4.5,-2.5) R18(5.5,-2.5) R19(6.5,-2.5) R20(7.5,-2.5) R21(8.5,-2.5) R22(9.5,-2.5) R23(10.5,-2.5) R24(11.5,-2.5) T1(-11.5,-3.5) T2(-10.5,-3.5) T3(-9.5,-3.5) T4(-8.5,-3.5) T5(-7.5,-3.5) T6(-6.5,-3.5) T7(-5.5,-3.5) T8(-4.5,-3.5) T9(-3.5,-3.5) T10(-2.5,-3.5) T11(-1.5,-3.5) T12(-0.5,-3.5) T13(0.5,-3.5) T14(1.5,-3.5) T15(2.5,-3.5) T16(3.5,-3.5) T17(4.5,-3.5) T18(5.5,-3.5) T19(6.5,-3.5) T20(7.5,-3.5) T21(8.5,-3.5) T22(9.5,-3.5) T23(10.5,-3.5) T24(11.5,-3.5) U1(-11.5,-4.5) U2(-10.5,-4.5) U3(-9.5,-4.5) U4(-8.5,-4.5) U5(-7.5,-4.5) U6(-6.5,-4.5) U7(-5.5,-4.5) U8(-4.5,-4.5) U9(-3.5,-4.5) U10(-2.5,-4.5) U11(-1.5,-4.5) U12(-0.5,-4.5) U13(0.5,-4.5) U14(1.5,-4.5) U15(2.5,-4.5) U16(3.5,-4.5) U17(4.5,-4.5) U18(5.5,-4.5) U19(6.5,-4.5) U20(7.5,-4.5) U21(8.5,-4.5) U22(9.5,-4.5) U23(10.5,-4.5) U24(11.5,-4.5) V1(-11.5,-5.5) V2(-10.5,-5.5) V3(-9.5,-5.5) V4(-8.5,-5.5) V5(-7.5,-5.5) V6(-6.5,-5.5) V7(-5.5,-5.5) V8(-4.5,-5.5) V9(-3.5,-5.5) V10(-2.5,-5.5) V11(-1.5,-5.5) V12(-0.5,-5.5) V13(0.5,-5.5) V14(1.5,-5.5) V15(2.5,-5.5) V16(3.5,-5.5) V17(4.5,-5.5) V18(5.5,-5.5) V19(6.5,-5.5) V20(7.5,-5.5) V21(8.5,-5.5) V22(9.5,-5.5) V23(10.5,-5.5) V24(11.5,-5.5) W1(-11.5,-6.5) W2(-10.5,-6.5) W3(-9.5,-6.5) W4(-8.5,-6.5) W5(-7.5,-6.5) W6(-6.5,-6.5) W7(-5.5,-6.5) W8(-4.5,-6.5) W9(-3.5,-6.5) W10(-2.5,-6.5) W11(-1.5,-6.5) W12(-0.5,-6.5) W13(0.5,-6.5) W14(1.5,-6.5) W15(2.5,-6.5) W16(3.5,-6.5) W17(4.5,-6.5) W18(5.5,-6.5) W19(6.5,-6.5) W20(7.5,-6.5) W21(8.5,-6.5) W22(9.5,-6.5) W23(10.5,-6.5) W24(11.5,-6.5) Y1(-11.5,-7.5) Y2(-10.5,-7.5) Y3(-9.5,-7.5) Y4(-8.5,-7.5) Y5(-7.5,-7.5) Y6(-6.5,-7.5) Y7(-5.5,-7.5) Y8(-4.5,-7.5) Y9(-3.5,-7.5) Y10(-2.5,-7.5) Y11(-1.5,-7.5) Y12(-0.5,-7.5) Y13(0.5,-7.5) Y14(1.5,-7.5) Y15(2.5,-7.5) Y16(3.5,-7.5) Y17(4.5,-7.5) Y18(5.5,-7.5) Y19(6.5,-7.5) Y20(7.5,-7.5) Y21(8.5,-7.5) Y22(9.5,-7.5) Y23(10.5,-7.5) Y24(11.5,-7.5)